# Altium footprint library micromouse pcb library.PcbLib: 68 footprints (part 1 of 5)
Each footprint in its own frame and in the unit in brackets; x right, y up, seen from the top. Pads: shape width x height; smd on the part's side, far side on the other; paste and mask are expansions set on the pad; w line width, h text height; cw(c..) or ccw(c..) is an arc to the next point about the centre after c.
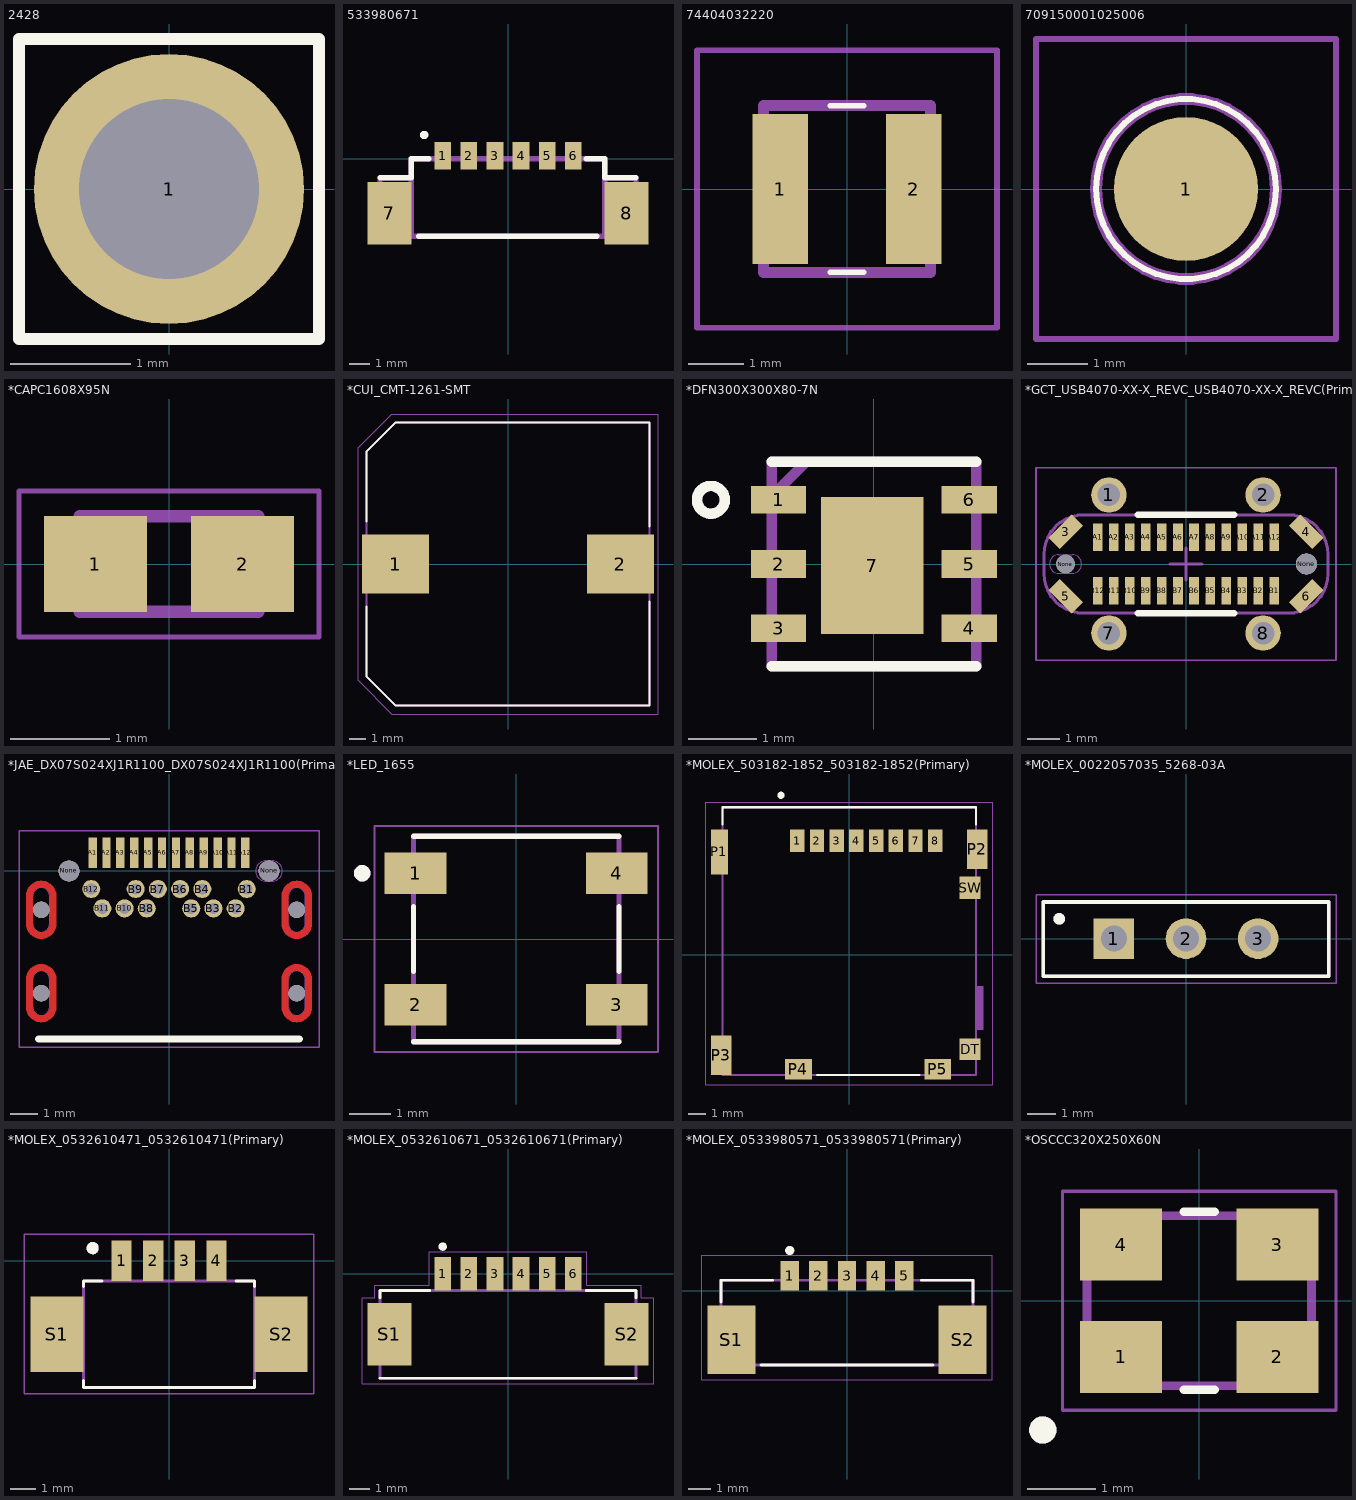
[diagram p0: the footprints below, top view; thin cyan lines are the x and y axes]

## 2428 [mm]
pads (1):
  round 2.25 hole 1.5: 1(0,0)
Top Overlay:
  lines w0.1: -1.25,-1.25 -1.25,1.25 1.25,1.25 1.25,-1.25 -1.25,-1.25
Mechanical 13:
  lines w0.2: -0.5,0 ccw(c0,0) 0.5,0 ccw(c0,0) -0.5,0
3D body "Pogo_pin_P75-E2.stp": height 12.5, standoff -3.94, extent -0.65,-0.65 0.65,0.65

## 533980671 [mm]
pads (8):
  rect 0.8x1.3 smd: 1(-3.125,0.15) 2(-1.875,0.15) 3(-0.625,0.15) 4(0.625,0.15) 5(1.875,0.15) 6(3.125,0.15)
  rect 2.1x3 smd: 7(-5.675,-2.6) 8(5.675,-2.6)
Top Overlay:
  circle w0.254: c-4.011,1.145 r0.072
  lines w0.254: -6.125,-0.9 -4.625,-0.9 -4.625,0 -3.784,0 ; -4.28,-3.7 4.259,-3.7 ; 3.735,0 4.625,0 4.625,-0.9 6.125,-0.9
Mechanical 13:
  lines w0.254: -4.625,-0.9 -6.125,-0.9 -6.125,-3.7 -4.625,-3.7 ; 4.625,-0.9 6.125,-0.9 6.125,-3.7 4.625,-3.7 ; -4.625,-3.7 -4.625,0 4.625,0 4.625,-3.7 ; -4.625,-3.7 4.625,-3.7
3D body "53398-0671.stp": height 4.69, standoff -0.01, extent -6.332,-3.982 6.318,0.218

## 74404032220 [mm]
pads (2):
  rect 1x2.7 smd: 1(-1.2,0) 2(1.2,0)
Top Overlay:
  lines w0.1: -0.3,-1.5 0.3,-1.5 ; -0.3,1.5 0.3,1.5
Mechanical 13:
  lines w0.2: -1.5,-1.5 1.5,-1.5 1.5,1.5 -1.5,1.5 -1.5,-1.5
Mechanical 15:
  lines w0.1: -2.7,-2.5 2.7,-2.5 2.7,2.5 -2.7,2.5 -2.7,-2.5
3D body "74404032220.stp": height 1.6, standoff 0, extent -1.6,-1.5 1.6,1.5

## 709150001025006 [mm]
pads (1):
  round 2.4 smd: 1(0,0)
Top Overlay:
  lines w0.1: -1.5,0 cw(c0,0) 1.5,0 cw(c0,0) -1.5,0
Mechanical 13:
  lines w0.2: -1.5,0 cw(c0,0) 1.5,0 cw(c0,0) -1.5,0
Mechanical 15:
  lines w0.1: -2.5,-2.5 -2.5,2.5 2.5,2.5 2.5,-2.5 -2.5,-2.5

## *CAPC1608X95N [mm]
pads (2):
  rect 1.04x0.97 smd: 1(-0.74,0) 2(0.74,0)
Mechanical 4:
  lines w0.127: -0.9,-0.48 -0.9,0.48 ; -0.9,-0.48 0.9,-0.48 ; -0.9,-0.48 -0.9,0.48 ; -0.9,-0.48 0.9,-0.48 ; -0.9,0.48 0.9,0.48 ; -0.9,0.48 0.9,0.48 ; 0.9,-0.48 0.9,0.48 ; 0.9,-0.48 0.9,0.48
Mechanical 16:
  lines w0.05: -1.51,-0.737 -1.51,0.737 1.51,0.737 1.51,-0.737 -1.51,-0.737
3D body "CAPC-0603-T0.9-BN.stp": height 0.9, standoff 0, extent -0.85,-0.45 0.85,0.45

## *CUI_CMT-1261-SMT [mm]
pads (2):
  rect 4x3.5 smd: 1(-6.7,0) 2(6.7,0)
Top Overlay:
  lines w0.127: -8.45,-2.54 -8.45,-6.7 -6.7,-8.45 8.45,-8.45 8.45,-2.25 ; -8.45,2.54 -8.45,6.7 -6.7,8.45 8.45,8.45 8.45,2.25
Mechanical 4:
  lines w0.127: -8.45,-6.7 -6.7,-8.45 ; -8.45,-6.7 -8.45,6.7 ; -8.45,-6.7 -6.7,-8.45 ; -8.45,-6.7 -8.45,6.7 ; -8.45,6.7 -6.7,8.45 ; -8.45,6.7 -6.7,8.45 ; -6.7,-8.45 8.45,-8.45 ; -6.7,-8.45 8.45,-8.45 ; -6.7,8.45 8.45,8.45 ; -6.7,8.45 8.45,8.45 ; 8.45,-8.45 8.45,8.45 ; 8.45,-8.45 8.45,8.45
Mechanical 16:
  lines w0.05: -8.95,-6.95 -6.95,-8.95 8.95,-8.95 8.95,8.95 -6.95,8.95 -8.95,6.95 -8.95,-6.95
3D body "CUI_DEVICES_CMT-1261-SMT.step": height 7.77, standoff -0.03, extent -8.55,-8.425 8.55,8.475

## *DFN300X300X80-7N [mil]
pads (7):
  rect 32x16 smd: 1(-55,37) 2(-55,0) 3(-55,-37) 4(55,-37) 5(55,0) 6(55,37)
  rect 59x79 smd: 7(-1,-1)
Top Overlay:
  lines w6: -59,-59 59,-59 ; -59,59 59,59 ; -102,37 cw(c-94,37) -86,37 cw(c-94,37) -102,37
Mechanical 4:
  lines w6: -102,37 cw(c-94,37) -86,37 ; -102,37 ccw(c-94,37) -86,37 ; -102,37 cw(c-94,37) -86,37 ; -102,37 ccw(c-94,37) -86,37 ; -59,-59 -59,59 ; -59,-59 59,-59 ; -59,-59 -59,59 ; -59,-59 59,-59 ; -59,59 59,59 ; -59,59 59,59 ; 59,-59 59,59 ; 59,-59 59,59 ; -59,39 -39,59 -59,39
3D body "HDC2080DMBR--3DModel-STEP-56544.STEP": height 30.53, standoff -0.97, extent -60.05,-61.11 58.06,57

## *GCT_USB4070-XX-X_REVC_USB4070-XX-X_REVC(Primary) [mm]
pads (34):
  round 1.1 hole 0.7: 1(-2.4,2.15) 2(2.4,2.15) 7(-2.4,-2.15) 8(2.4,-2.15)
  rect 1.03x0.5 smd rot 45: 3(-3.75,1) 6(3.75,-1)
  rect 1.03x0.5 smd rot 135: 4(3.75,1) 5(-3.75,-1)
  rect 0.3x0.85 smd: A1(-2.75,0.83) A2(-2.25,0.83) A3(-1.75,0.83) A4(-1.25,0.83) A5(-0.75,0.83) A6(-0.25,0.83) A7(0.25,0.83) A8(0.75,0.83) A9(1.25,0.83) A10(1.75,0.83) A11(2.25,0.83) A12(2.75,0.83) B1(2.75,-0.83) B2(2.25,-0.83) B3(1.75,-0.83) B4(1.25,-0.83) B5(0.75,-0.83) B6(0.25,-0.83) B7(-0.25,-0.83) B8(-0.75,-0.83) B9(-1.25,-0.83) B10(-1.75,-0.83) B11(-2.25,-0.83) B12(-2.75,-0.83)
  round 0.58 hole 0.58 unplated: None(-3.75,0)
  round 0.66 hole 0.66 unplated: None(3.75,0)
Top Overlay:
  lines w0.2: -1.5,-1.53 1.5,-1.53 ; -1.5,1.53 1.5,1.53
Top Solder:
  region: -4.354,0.39 -3.15,0.39 -3.15,-0.39 -4.354,-0.39
Bottom Solder:
  region: -4.356,0.39 -3.15,0.39 -3.15,-0.391 -4.356,-0.391
Mechanical 1:
  lines w0: -4.25,0 cw(c-3.96,0) -3.96,0.29 -3.54,0.29 cw(c-3.54,0) -3.25,0 cw(c-3.54,0) -3.54,-0.29 -3.96,-0.29 cw(c-3.96,0) -4.25,0
Mechanical 4:
  lines w0.1: -4.42,-0.3 ccw(c-3.19,-0.3) -3.19,-1.53 ; -4.42,-0.3 ccw(c-3.19,-0.3) -3.19,-1.53 ; -4.42,-0.3 -4.42,0.3 ; -4.42,-0.3 -4.42,0.3 ; -4.42,0.3 cw(c-3.19,0.3) -3.19,1.53 ; -4.42,0.3 cw(c-3.19,0.3) -3.19,1.53 ; -3.19,-1.53 3.19,-1.53 ; -3.19,-1.53 3.19,-1.53 ; -3.19,1.53 3.19,1.53 ; -3.19,1.53 3.19,1.53 ; 3.19,-1.53 ccw(c3.19,-0.3) 4.42,-0.3 ; 3.19,-1.53 ccw(c3.19,-0.3) 4.42,-0.3 ; 3.19,1.53 cw(c3.19,0.3) 4.42,0.3 ; 3.19,1.53 cw(c3.19,0.3) 4.42,0.3 ; 4.42,-0.3 4.42,0.3 ; 4.42,-0.3 4.42,0.3 ; -0.5,0 0.5,0 -0.5,0 ; 0,-0.5 0,0.5 0,-0.5
Mechanical 16:
  lines w0.05: -4.67,-3 -4.67,3 4.67,3 4.67,-3 -4.67,-3
3D body "EB-500-5010.STEP": height 9.19, standoff -1.16, extent -4.47,-2.3 4.47,2.3

## *JAE_DX07S024XJ1R1100_DX07S024XJ1R1100(Primary) [mm]
pads (30):
  rect 0.3x1.1 smd: A1(-2.75,0.66) A2(-2.25,0.66) A3(-1.75,0.66) A4(-1.25,0.66) A5(-0.75,0.66) A6(-0.25,0.66) A7(0.25,0.66) A8(0.75,0.66) A9(1.25,0.66) A10(1.75,0.66) A11(2.25,0.66) A12(2.75,0.66)
  round 0.65 hole 0.4: B1(2.8,-0.65) B2(2.4,-1.35) B3(1.6,-1.35) B4(1.2,-0.65) B5(0.8,-1.35) B6(0.4,-0.65) B7(-0.4,-0.65) B8(-0.8,-1.35) B9(-1.2,-0.65) B10(-1.6,-1.35) B11(-2.4,-1.35) B12(-2.8,-0.65)
  round 0.6 hole 0.6 unplated: None(-4.6,-4.4) None(-4.6,-1.4) None(4.6,-4.4) None(4.6,-1.4)
  round 0.75 hole 0.75 unplated: None(-3.6,0) None(3.6,0)
Top Layer:
  lines w0.25: -5.025,-4.9 ccw(c-4.6,-4.9) -4.6,-5.325 ccw(c-4.6,-4.9) -4.175,-4.9 -4.175,-3.9 ccw(c-4.6,-3.9) -4.6,-3.475 ccw(c-4.6,-3.9) -5.025,-3.9 -5.025,-4.9 ; -5.025,-1.9 ccw(c-4.6,-1.9) -4.6,-2.325 ccw(c-4.6,-1.9) -4.175,-1.9 -4.175,-0.9 ccw(c-4.6,-0.9) -4.6,-0.475 ccw(c-4.6,-0.9) -5.025,-0.9 -5.025,-1.9 ; 4.175,-4.9 ccw(c4.6,-4.9) 4.6,-5.325 ccw(c4.6,-4.9) 5.025,-4.9 5.025,-3.9 ccw(c4.6,-3.9) 4.6,-3.475 ccw(c4.6,-3.9) 4.175,-3.9 4.175,-4.9 ; 4.175,-1.9 ccw(c4.6,-1.9) 4.6,-2.325 ccw(c4.6,-1.9) 5.025,-1.9 5.025,-0.9 ccw(c4.6,-0.9) 4.6,-0.475 ccw(c4.6,-0.9) 4.175,-0.9 4.175,-1.9
Top Overlay:
  lines w0.254: -4.7,-6.05 4.7,-6.05
Top Paste:
  lines w0.25: -5.025,-4.9 ccw(c-4.6,-4.9) -4.6,-5.325 ccw(c-4.6,-4.9) -4.175,-4.9 -4.175,-3.9 ccw(c-4.6,-3.9) -4.6,-3.475 ccw(c-4.6,-3.9) -5.025,-3.9 -5.025,-4.9 ; -5.025,-1.9 ccw(c-4.6,-1.9) -4.6,-2.325 ccw(c-4.6,-1.9) -4.175,-1.9 -4.175,-0.9 ccw(c-4.6,-0.9) -4.6,-0.475 ccw(c-4.6,-0.9) -5.025,-0.9 -5.025,-1.9 ; 4.175,-4.9 ccw(c4.6,-4.9) 4.6,-5.325 ccw(c4.6,-4.9) 5.025,-4.9 5.025,-3.9 ccw(c4.6,-3.9) 4.6,-3.475 ccw(c4.6,-3.9) 4.175,-3.9 4.175,-4.9 ; 4.175,-1.9 ccw(c4.6,-1.9) 4.6,-2.325 ccw(c4.6,-1.9) 5.025,-1.9 5.025,-0.9 ccw(c4.6,-0.9) 4.6,-0.475 ccw(c4.6,-0.9) 4.175,-0.9 4.175,-1.9
Top Solder:
  drawing of 4 lines, arcs and shapes, not listed
Bottom Solder:
  drawing of 4 lines, arcs and shapes, not listed
Mechanical 1:
  lines w0: -4.9,-4.9 ccw(c-4.6,-4.9) -4.6,-5.2 ccw(c-4.6,-4.9) -4.3,-4.9 -4.3,-3.9 ccw(c-4.6,-3.9) -4.6,-3.6 ccw(c-4.6,-3.9) -4.9,-3.9 -4.9,-4.9 ; -4.9,-1.9 ccw(c-4.6,-1.9) -4.6,-2.2 ccw(c-4.6,-1.9) -4.3,-1.9 -4.3,-0.9 ccw(c-4.6,-0.9) -4.6,-0.6 ccw(c-4.6,-0.9) -4.9,-0.9 -4.9,-1.9 ; 3.125,0 cw(c3.5,0) 3.5,0.375 3.7,0.375 cw(c3.7,0) 4.075,0 cw(c3.7,0) 3.7,-0.375 3.5,-0.375 cw(c3.5,0) 3.125,0 ; 4.3,-4.9 ccw(c4.6,-4.9) 4.6,-5.2 ccw(c4.6,-4.9) 4.9,-4.9 4.9,-3.9 ccw(c4.6,-3.9) 4.6,-3.6 ccw(c4.6,-3.9) 4.3,-3.9 4.3,-4.9 ; 4.3,-1.9 ccw(c4.6,-1.9) 4.6,-2.2 ccw(c4.6,-1.9) 4.9,-1.9 4.9,-0.9 ccw(c4.6,-0.9) 4.6,-0.6 ccw(c4.6,-0.9) 4.3,-0.9 4.3,-1.9
Mechanical 16:
  lines w0.05: -5.4,-6.35 -5.4,1.45 5.4,1.45 5.4,-6.35 -5.4,-6.35
3D body "DX07S024XJ1R1100--3DModel-STEP-56544.STEP": height 3.45, standoff -0.66, extent -4.7,-8.871 4.7,0.889

## *LED_1655 [mm]
pads (4):
  rect 1.5x1 smd: 1(-2.45,1.6) 2(-2.45,-1.6) 3(2.45,-1.6) 4(2.45,1.6)
Top Overlay:
  circle w0.2: c-3.75,1.6 r0.1
  lines w0.127: -2.5,-2.5 2.5,-2.5 ; -2.5,-0.787 -2.5,0.787 ; -2.5,2.5 2.5,2.5 ; 2.5,-0.787 2.5,0.787
Mechanical 4:
  circle w0.2: c-3.75,1.6 r0.1
  circle w0.2: c-3.75,1.6 r0.1
  lines w0.127: -2.5,-2.5 2.5,-2.5 ; -2.5,-2.5 -2.5,2.5 ; -2.5,-2.5 2.5,-2.5 ; -2.5,-2.5 -2.5,2.5 ; -2.5,2.5 2.5,2.5 ; -2.5,2.5 2.5,2.5 ; 2.5,-2.5 2.5,2.5 ; 2.5,-2.5 2.5,2.5
Mechanical 16:
  lines w0.05: -3.45,-2.75 3.45,-2.75 3.45,2.75 -3.45,2.75 -3.45,-2.75
3D body "WS2812_RGB_LED_updated.stp": height 1.5, standoff -0.2, extent -2.675,-2.475 2.675,2.475

## *MOLEX_503182-1852_503182-1852(Primary) [mm]
pads (15):
  rect 0.8x1.24 smd: 1(-2.9,6.355) 2(-1.8,6.355) 3(-0.7,6.355) 4(0.4,6.355) 5(1.5,6.355) 6(2.6,6.355) 7(3.7,6.355) 8(4.8,6.355)
  rect 1.16x1.2 smd: DT(6.74,-5.275)
  rect 0.95x2.5 smd: P1(-7.245,5.725)
  rect 1.15x2.2 smd: P2(7.145,5.875) P3(-7.145,-5.605)
  rect 1.5x1.15 smd: P4(-2.84,-6.4) P5(4.94,-6.4)
  rect 1.16x1.25 smd: SW(6.74,3.725)
Top Overlay:
  circle w0.2: c-3.81,8.89 r0.1
  lines w0.127: -7.07,7.28 -7.07,8.225 7.07,8.225 7.07,7.28 ; -1.8,-6.725 3.9,-6.725
Mechanical 4:
  lines w0.127: -7.07,-6.725 7.07,-6.725 ; -7.07,-6.725 -7.07,8.225 ; -7.07,-6.725 7.07,-6.725 ; -7.07,-6.725 -7.07,8.225 ; -7.07,8.225 7.07,8.225 ; -7.07,8.225 7.07,8.225 ; 7.07,-6.725 7.07,8.225 ; 7.07,-6.725 7.07,8.225
Mechanical 16:
  region: 7.085,-1.775 7.47,-1.775 7.47,-4.184 7.085,-4.184
  lines w0.05: -8,-7.25 8,-7.25 8,8.5 -8,8.5 -8,-7.25
3D body "5031821852--3DModel-STEP-56544.STEP": height 1.45, standoff -0.02, extent -7.47,-6.695 7.47,8.255

## *MOLEX_0022057035_5268-03A [mm]
pads (3):
  rect 1.408x1.408 hole 0.9: 1(-2.5,0)
  round 1.408 hole 0.9: 2(0,0) 3(2.5,0)
Top Overlay:
  circle w0.2: c-4.394,0.686 r0.1
  lines w0.127: -4.95,-1.3 4.95,-1.3 4.95,1.27 -4.95,1.27 -4.95,-1.3
Mechanical 4:
  circle w0.2: c-4.394,0.686 r0.1
  circle w0.2: c-4.394,0.686 r0.1
  lines w0.127: -4.95,-1.3 4.95,-1.3 ; -4.95,-1.3 -4.95,1.27 ; -4.95,-1.3 4.95,-1.3 ; -4.95,-1.3 -4.95,1.27 ; -4.95,1.27 4.95,1.27 ; -4.95,1.27 4.95,1.27 ; 4.95,-1.3 4.95,1.27 ; 4.95,-1.3 4.95,1.27
Mechanical 16:
  lines w0.05: -5.2,-1.55 5.2,-1.55 5.2,1.524 -5.2,1.524 -5.2,-1.55
3D body "sharp4.step": height 19.68, standoff -7.92, extent -4.445,-4.216 4.445,6.696

## *MOLEX_0532610471_0532610471(Primary) [mm]
pads (6):
  rect 0.8x1.6 smd: 1(-1.875,0) 2(-0.625,0) 3(0.625,0) 4(1.875,0)
  rect 2.1x3 smd: S1(-4.425,-2.9) S2(4.425,-2.9)
Top Overlay:
  circle w0.24: c-3.015,0.5 r0.12
  lines w0.127: -3.375,-4.725 -3.375,-5 3.375,-5 3.375,-4.725 ; -3.375,-1 -3.375,-0.8 -2.65,-0.8 ; 2.65,-0.8 3.375,-0.8 3.375,-1
Mechanical 4:
  circle w0.24: c-3.015,0.5 r0.12
  circle w0.24: c-3.015,0.5 r0.12
  lines w0.127: -3.375,-5 3.375,-5 ; -3.375,-5 -3.375,-0.8 ; -3.375,-5 3.375,-5 ; -3.375,-5 -3.375,-0.8 ; -3.375,-0.8 3.375,-0.8 ; -3.375,-0.8 3.375,-0.8 ; 3.375,-5 3.375,-0.8 ; 3.375,-5 3.375,-0.8
Mechanical 16:
  lines w0.05: -5.725,-5.25 -5.725,1.05 5.725,1.05 5.725,-5.25 -5.725,-5.25
3D body "533980471.stp": height 4.73, standoff -0.02, extent -5.075,-4.318 5.075,-0.118

## *MOLEX_0532610671_0532610671(Primary) [mm]
pads (8):
  rect 0.8x1.6 smd: 1(-3.125,0) 2(-1.875,0) 3(-0.625,0) 4(0.625,0) 5(1.875,0) 6(3.125,0)
  rect 2.1x3 smd: S1(-5.675,-2.9) S2(5.675,-2.9)
Top Overlay:
  circle w0.2: c-3.125,1.3 r0.1
  lines w0.127: -6.125,-5 6.125,-5 ; -6.125,-1.143 -6.125,-0.8 -3.75,-0.8 ; 3.75,-0.8 6.125,-0.8 6.125,-1.143
Mechanical 4:
  lines w0.127: -6.125,-5 6.125,-5 ; -6.125,-5 -6.125,-0.8 ; -6.125,-5 6.125,-5 ; -6.125,-5 -6.125,-0.8 ; -6.125,-0.8 6.125,-0.8 ; -6.125,-0.8 6.125,-0.8 ; 6.125,-5 6.125,-0.8 ; 6.125,-5 6.125,-0.8
Mechanical 16:
  lines w0.05: -6.975,-5.25 -6.975,-1.15 -6.375,-1.15 -6.375,-0.55 -3.775,-0.55 -3.775,1.05 3.775,1.05 3.775,-0.55 6.375,-0.55 6.375,-1.15 6.975,-1.15 6.975,-5.25 -6.975,-5.25
3D body "JST - GH - SMD (R) - 6Pin - 1.25mm.stp": height 3.53, standoff 0, extent -6.414,-5.283 6.414,0.064

## *MOLEX_0533980571_0533980571(Primary) [mm]
pads (7):
  rect 0.8x1.3 smd: 1(-2.5,0.65) 2(-1.25,0.65) 3(0,0.65) 4(1.25,0.65) 5(2.5,0.65)
  rect 2.1x3 smd: S1(-5.05,-2.15) S2(5.05,-2.15)
Top Overlay:
  circle w0.2: c-2.5,1.75 r0.1
  lines w0.127: -5.5,-0.5 -5.5,0.45 -3.25,0.45 ; -3.75,-3.25 3.75,-3.25 ; 3.25,0.45 5.5,0.45 5.5,-0.5
Mechanical 4:
  lines w0.127: -5.5,-3.25 5.5,-3.25 ; -5.5,-3.25 -5.5,0.45 ; -5.5,-3.25 5.5,-3.25 ; -5.5,-3.25 -5.5,0.45 ; -5.5,0.45 5.5,0.45 ; -5.5,0.45 5.5,0.45 ; 5.5,-3.25 5.5,0.45 ; 5.5,-3.25 5.5,0.45
Mechanical 16:
  lines w0.05: -6.35,-3.9 6.35,-3.9 6.35,1.55 -6.35,1.55 -6.35,-3.9
3D body "533980571.stp": height 4.73, standoff -0.02, extent -5.7,-3.251 5.7,0.949

## *OSCCC320X250X60N [mm]
pads (4):
  rect 1.21x1.06 smd: 1(-1.15,-0.825) 2(1.15,-0.825) 3(1.15,0.825) 4(-1.15,0.825)
Top Overlay:
  circle w0.2: c-2.3,-1.9 r0.1
  lines w0.127: -0.23,-1.31 0.23,-1.31 ; -0.23,1.31 0.23,1.31
Mechanical 4:
  circle w0.2: c-2.3,-1.9 r0.1
  circle w0.2: c-2.3,-1.9 r0.1
  lines w0.127: -1.65,-1.25 1.65,-1.25 ; -1.65,-1.25 -1.65,1.25 ; -1.65,-1.25 1.65,-1.25 ; -1.65,-1.25 -1.65,1.25 ; -1.65,1.25 1.65,1.25 ; -1.65,1.25 1.65,1.25 ; 1.65,-1.25 1.65,1.25 ; 1.65,-1.25 1.65,1.25
Mechanical 16:
  lines w0.05: -2.01,-1.61 2.01,-1.61 2.01,1.61 -2.01,1.61 -2.01,-1.61
3D body "NX3225SA-12.000M-STD-CRS-2--3DModel-STEP-56544.STEP": height 0.6, standoff 0, extent -1.6,-1.25 1.6,1.25